# Altium footprint library cool_library.PcbLib: 1182 footprints (part 63 of 75)
Each footprint in its own frame and in the unit in brackets; x right, y up, seen from the top. Pads: shape width x height; smd on the part's side, far side on the other; paste and mask are expansions set on the pad; w line width, h text height; cw(c..) or ccw(c..) is an arc to the next point about the centre after c.
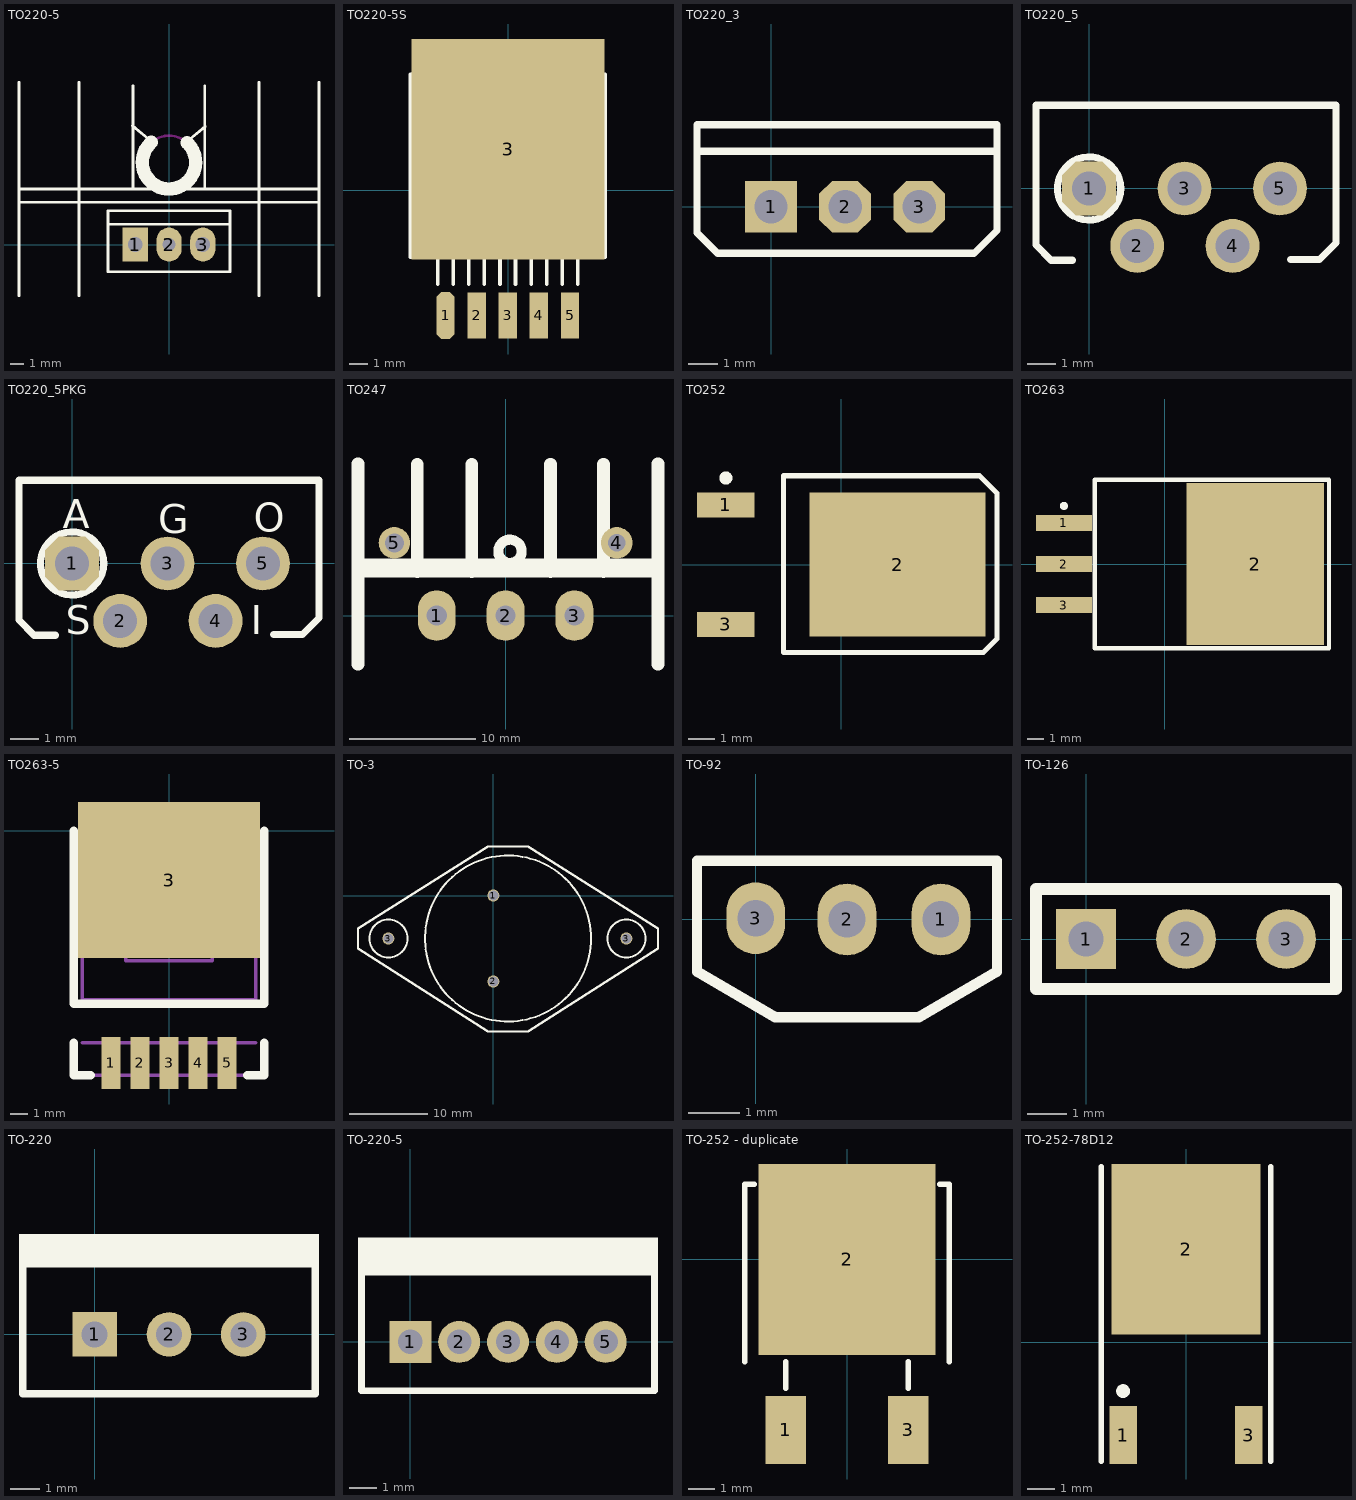
[diagram p62: the footprints below, top view; thin cyan lines are the x and y axes]

## TO220-5 [mm]
pads (3):
  rect 1.905x2.54 hole 1.1: 1(-2.54,0)
  oval 1.905x2.54 hole 1: 2(0,0)
  oval 1.905x2.54 hole 1.1: 3(2.54,0)
Top Overlay:
  lines w0.203: -11.252,-3.835 -11.252,12.165 ; -11.252,3.165 11.248,3.165 ; -11.252,4.165 11.248,4.165 ; -6.752,-3.835 -6.752,12.165 ; -4.572,1.524 4.572,1.524 ; -2.752,8.915 -1.327,7.731 ; -2.701,4.165 -2.701,11.915 ; 1.297,7.683 2.722,8.868 ; 2.686,4.165 2.686,11.915 ; 6.748,-3.835 6.748,12.165 ; 11.248,-3.835 11.248,12.165 ; -4.572,-2.032 -4.572,2.54 4.572,2.54 4.572,-2.032 -4.572,-2.032
  lines w1: -1.327,7.663 ccw(c-0.002,6.165) 1.348,7.64
Keep-Out Layer:
  circle w0.2: c-0.002,6.165 r2

## TO220-5S [mm]
pads (6):
  oct 0.995x2.56 smd: 1(-3.4,-6.8)
  rect 0.995x2.5 smd: 2(-1.707,-6.8) 3(-0.013,-6.8) 4(1.68,-6.8) 5(3.373,-6.8)
  rect 10.5x12 smd: 3(0,2.24)
Top Overlay:
  lines w0.2: -3.823,-5.1 -3.823,-3.625 ; -2.977,-5.1 -2.977,-3.625 ; -2.13,-5.1 -2.13,-3.625 ; -1.283,-5.1 -1.283,-3.625 ; -0.437,-5.1 -0.437,-3.625 ; 0.41,-5.1 0.41,-3.625 ; 1.257,-5.1 1.257,-3.625 ; 2.103,-5.1 2.103,-3.625 ; 2.95,-5.1 2.95,-3.625 ; 3.797,-5.1 3.797,-3.625 ; -5.305,-3.625 -4.882,-3.202 ; -5.305,-3.625 -5.305,5.053 ; -5.305,-3.625 5.278,-3.625 ; -5.305,5.053 -4.882,4.63 ; -5.305,5.053 -5.305,6.323 -3.823,6.747 3.797,6.747 5.278,6.323 5.278,5.053 ; -5.305,5.053 5.278,5.053 ; -4.882,-3.202 4.855,-3.202 ; -4.882,-3.202 -4.882,4.63 ; -4.882,4.63 4.855,4.63 ; 4.855,-3.202 4.855,4.63 ; 4.855,-3.202 5.278,-3.625 ; 4.855,4.63 5.278,5.053 ; 5.278,-3.625 5.278,5.053
  text "5" at 2.876,-2.942 h1.27
  text "1" at -3.682,-2.97 h1.27

## TO220_3 [mil]
pads (3):
  rect 70x70 hole 45: 1(0,0)
  oct 70x70 hole 45: 2(100,0) 3(200,0)
Top Overlay:
  lines w10: -94,75 302,75 ; -100,-35 -72,-63 274,-63 305,-32 305,111 -100,111 -100,-35
3D body: height 728.35, standoff -389.76, extent -104.45,-72.17 305,105

## TO220_5 [mm]
pads (5):
  oct 1.905x1.905 hole 1.2: 1(0,0)
  round 1.905 hole 1.2: 2(1.702,-2.032) 3(3.378,0) 4(5.08,-2.032) 5(6.756,0)
Top Overlay:
  circle w0.254: c0,0 r1.118
  lines w0.254: -0.584,-2.54 -1.346,-2.54 -1.88,-2.006 -1.88,1.34 -1.88,2.946 8.74,2.946 8.74,1.432 8.74,-1.928 8.151,-2.517 7.135,-2.517
3D body: height 19.35, standoff -2.26, extent -1.68,-2.1 8.48,2.8

## TO220_5PKG [mm]
pads (5):
  oct 1.905x1.905 hole 1.2: 1(0,0)
  round 1.905 hole 1.2: 2(1.702,-2.032) 3(3.378,0) 4(5.08,-2.032) 5(6.756,0)
Top Overlay:
  circle w0.254: c0,0 r1.118
  lines w0.254: -0.584,-2.54 -1.346,-2.54 -1.88,-2.006 -1.88,1.34 -1.88,2.946 8.74,2.946 8.74,1.432 8.74,-1.928 8.151,-2.517 7.135,-2.517
  text "O" at 6.426,1.118 h1.02
  text "G" at 3.048,1.067 h1.02
  text "I" at 6.325,-2.515 h1.02
  text "S" at -0.229,-2.515 h1.02
  text "A" at -0.33,1.245 h1.02
3D body: height 19.35, standoff -2.26, extent -1.68,-2.1 8.48,2.8

## TO247 [mm]
pads (5):
  oval 3x4 hole 1.6: 1(-5.45,0) 2(0,0) 3(5.45,0)
  round 2.5 hole 1.4: 4(8.8,5.75)
  round 2.5 hole 1.5: 5(-8.8,5.75)
Top Overlay:
  circle w0.8: c0.345,5.08 r0.925
  lines w1: -11.684,-3.849 -11.684,12.006 ; -6.985,3.486 -6.985,11.986 ; -2.667,3.486 -2.667,11.986 ; 3.556,3.486 3.556,11.986 ; 7.747,3.486 7.747,11.986 ; 12.065,-3.849 12.065,12.006
  lines w1.5: -11.43,3.75 11.43,3.75
Mechanical 15:
  lines w0.1: -0.5,0 0.5,0 ; 0,-0.5 0,0.5
3D body: height 25, standoff -11.05, extent -7.9,-2.337 7.9,2.973

## TO252 [mm] "D-PAK  / SOT-428"
height 2.38
pads (3):
  rect 2.2x0.95 smd: 1(-4.4,2.28) 3(-4.4,-2.28)
  rect 6.7x5.5 smd: 2(2.15,0)
Top Overlay:
  circle w0.25: c-4.4,3.305 r0.125
  lines w0.1: -2.2,-3.35 -2.2,3.35
  lines w0.2: -2.2,-3.35 -2.2,3.391 5.278,3.391 5.944,2.725 5.944,-2.824 5.418,-3.35 -2.2,-3.35
3D body: height 2.31, standoff 0, extent -4.475,-3.3 4.775,3.3

## TO263 [mm] "D2PAK936"
height 4.5
pads (4):
  rect 3.45x1 smd: 1(-6.225,2.54) 2(-6.225,0) 3(-6.225,-2.54)
  rect 8.5x10 smd: 2(5.588,0)
Top Overlay:
  circle w0.25: c-6.225,3.59 r0.125
  lines w0.254: -4.318,-5.207 10.16,-5.207 10.16,5.207 -4.318,5.207 -4.318,-5.207
3D body: height 4.88, standoff 0.08, extent -6.819,-5.054 8.851,4.946

## TO263-5 [mil] "5-Lead TO-263 (S), (National TS5B)"
pads (6):
  rect 43x120 smd: 1(-133.86,-536.34) 2(-66.93,-536.34) 3(0,-536.34) 4(66.93,-536.34) 5(133.86,-536.34)
  rect 420x360 smd: 3(0,-114.17)
Top Overlay:
  lines w19.68: -220,-490 -220,-565 -180,-565 ; -220,0 -220,-400 220,-400 220,0 ; 180,-565 220,-565 220,-490
Mechanical 1:
  lines w7.87: -200,-565 200,-565 ; -200,-490 200,-490 ; -200,-50 -100,-50 -100,-300 100,-300 100,-50 200,-50 ; -150.5,-565 -150.5,-490 ; -117.5,-565 -117.5,-490 ; -83.5,-565 -83.5,-490 ; -50.5,-565 -50.5,-490 ; -16.5,-565 -16.5,-490 ; 16.5,-565 16.5,-490 ; 50.5,-565 50.5,-490 ; 83.5,-565 83.5,-490 ; 117.5,-565 117.5,-490 ; 150.5,-565 150.5,-490 ; -200,-390 200,-390 200,0 -200,0 -200,-390

## TO-3 [mil]
pads (4):
  round 60 hole 50: 1(0,0) 2(0,-430) 3(-525,-215) 3(665,-215)
Top Overlay:
  circle w10: c73,-215 r415
  circle w10: c665,-215 r95
  circle w10: c-525,-215 r95
  lines w12: -677,-265 -27,-680 173,-680 823,-265 823,-165 173,245 -27,245 -677,-165 -677,-265

## TO-92 [mil]
pads (3):
  oval 45x55 hole 28: 1(142,0) 2(70,0) 3(0,1)
Top Overlay:
  lines w8: -45,-40 -45,45 185,45 185,-40 125,-75 15,-75 -45,-40

## TO-126 [mil]
pads (3):
  rect 60x60 hole 35: 1(0,0)
  round 60 hole 35: 2(100,0) 3(200,0)
Top Overlay:
  lines w12: -50,-50 -50,50 250,50 250,-50 -50,-50

## TO-220 [mil]
pads (3):
  rect 60x60 hole 35: 1(0,0)
  round 60 hole 35: 2(100,0) 3(200,0)
Top Overlay:
  rectangle: -102,95 302,135
  lines w10: -97,-80 297,-80 297,95 -97,95 -97,-80

## TO-220-5 [mil]
pads (5):
  rect 60x60 hole 35: 1(0,0)
  round 60 hole 35: 2(70,0) 3(140,0) 4(210,0) 5(280,0)
Top Overlay:
  rectangle: -75,100 355,150
  lines w10: -70,-70 -70,100 350,100 350,-70 -70,-70

## TO-252 - duplicate [mil]
height 88
pads (3):
  rect 59.06x100 smd: 1(-90,-250) 3(90,-250)
  rect 260x280 smd: 2(0,0)
Top Overlay:
  lines w8: -150,-150 -150,110 -136,110 ; -90,-189 -90,-150 ; 90,-189 90,-150 ; 136,110 150,110 150,-150

## TO-252-78D12 [mm] "这是贴片78D12的封装"
height 2.4
pads (3):
  rect 1x2.1 smd: 1(-2.285,-3.375) 3(2.285,-3.375)
  rect 5.4x6.2 smd: 2(0,3.375)
Top Overlay:
  circle w0.25: c-2.285,-1.775 r0.125
  lines w0.2: -3.085,-4.325 -3.085,6.375 ; 3.085,-4.325 3.085,6.375